# Altium schematic symbol library jlcpcb_2025_04_capacitors_extended_0805.schlib: 3281 symbols (part 16 of 18)
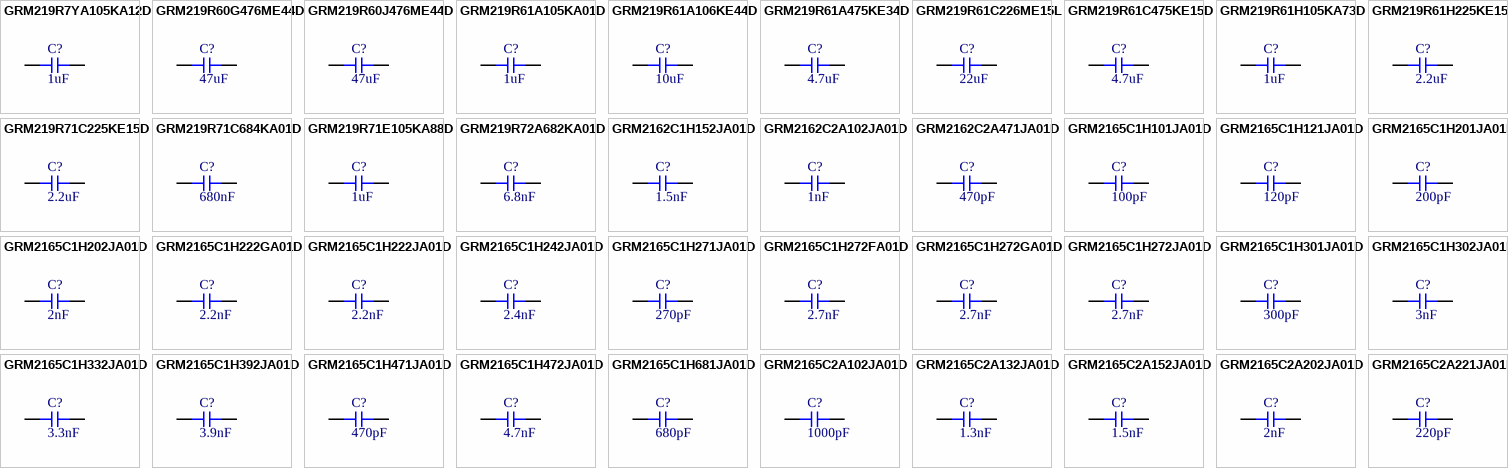
[diagram p97: symbols GRM219R7YA105KA12D to GRM2165C2A221JA01D]

## GRM2165C1H471JA01D
designator C?  Capacitance: 470pF  (hidden comment: *)
Capacitor, Ceramic (MLCC), 470pF, ±5%, 50V, C0G, ±5%, SMD 0805; Manufacturer: Murata Electronics; Manufacturer Part Number: GRM2165C1H471JA01D; Package Size: 0805; JLCPCB Basic Part: No; JLCPCB Part Number: C97902; Supplier 1: LCSC; Category: Capacitors - MLCC; Supplier Part Number 1: C97902; Tolerance: ±5%; Voltage Rating: 50V; Temperature Coefficient: C0G; RoHS: Yes; ComponentLink1Description: Datasheet; ComponentLink1URL: https://wmsc.lcsc.com/wmsc/upload/file/pdf/v2/lcsc/1811101813_Murata-Electronics-GRM2165C1H471JA01D_C97902.pdf; ComponentLink2Description: JLCPCB Part URL; ComponentLink2URL: https://jlcpcb.com/partdetail/C97902; ComponentLink3Description: LCSC Part URL; ComponentLink3URL: https://lcsc.com/product-detail/Multilayer-Ceramic-Capacitors-MLCC---SMD-SMT_Murata-Electronics-Murata-Electronics-GRM2165C1H471JA01D_C97902.html
footprint CAP-0805 (0805 (2012M) Capacitor)
pins: 1, 2

## GRM2165C1H472JA01D
designator C?  Capacitance: 4.7nF  (hidden comment: *)
Capacitor, Ceramic (MLCC), 4.7nF, ±5%, 50V, C0G, ±5%, SMD 0805; Manufacturer: Murata Electronics; Manufacturer Part Number: GRM2165C1H472JA01D; Package Size: 0805; JLCPCB Basic Part: No; JLCPCB Part Number: C77063; Supplier 1: LCSC; Category: Capacitors - MLCC; Supplier Part Number 1: C77063; Tolerance: ±5%; Voltage Rating: 50V; Temperature Coefficient: C0G; RoHS: Yes; ComponentLink1Description: Datasheet; ComponentLink1URL: https://wmsc.lcsc.com/wmsc/upload/file/pdf/v2/lcsc/2304140030_Murata-Electronics-GRM2165C1H472JA01D_C77063.pdf; ComponentLink2Description: JLCPCB Part URL; ComponentLink2URL: https://jlcpcb.com/partdetail/C77063; ComponentLink3Description: LCSC Part URL; ComponentLink3URL: https://lcsc.com/product-detail/Multilayer-Ceramic-Capacitors-MLCC---SMD-SMT_Murata-Electronics-Murata-Electronics-GRM2165C1H472JA01D_C77063.html
footprint CAP-0805 (0805 (2012M) Capacitor)
pins: 1, 2

## GRM2165C1H681JA01D
designator C?  Capacitance: 680pF  (hidden comment: *)
Capacitor, Ceramic (MLCC), 680pF, ±5%, 50V, C0G, ±5%, SMD 0805; Manufacturer: Murata Electronics; Manufacturer Part Number: GRM2165C1H681JA01D; Package Size: 0805; JLCPCB Basic Part: No; JLCPCB Part Number: C117988; Supplier 1: LCSC; Category: Capacitors - MLCC; Supplier Part Number 1: C117988; Tolerance: ±5%; Voltage Rating: 50V; Temperature Coefficient: C0G; RoHS: Yes; ComponentLink1Description: Datasheet; ComponentLink1URL: https://wmsc.lcsc.com/wmsc/upload/file/pdf/v2/lcsc/2304140030_Murata-Electronics-GRM2165C1H681JA01D_C117988.pdf; ComponentLink2Description: JLCPCB Part URL; ComponentLink2URL: https://jlcpcb.com/partdetail/C117988; ComponentLink3Description: LCSC Part URL; ComponentLink3URL: https://lcsc.com/product-detail/Multilayer-Ceramic-Capacitors-MLCC---SMD-SMT_Murata-Electronics-Murata-Electronics-GRM2165C1H681JA01D_C117988.html
footprint CAP-0805 (0805 (2012M) Capacitor)
pins: 1, 2

## GRM2165C2A102JA01D
designator C?  Capacitance: 1000pF  (hidden comment: *)
Capacitor, Ceramic (MLCC), 1000pF, ±5%, 100V, C0G, ±5%, SMD 0805; Manufacturer: Murata Electronics; Manufacturer Part Number: GRM2165C2A102JA01D; Package Size: 0805; JLCPCB Basic Part: No; JLCPCB Part Number: C162289; Supplier 1: LCSC; Category: Capacitors - MLCC; Supplier Part Number 1: C162289; Tolerance: ±5%; Voltage Rating: 100V; Temperature Coefficient: C0G; RoHS: Yes; ComponentLink1Description: Datasheet; ComponentLink1URL: https://wmsc.lcsc.com/wmsc/upload/file/pdf/v2/lcsc/2304140030_Murata-Electronics-GRM2165C2A102JA01D_C162289.pdf; ComponentLink2Description: JLCPCB Part URL; ComponentLink2URL: https://jlcpcb.com/partdetail/C162289; ComponentLink3Description: LCSC Part URL; ComponentLink3URL: https://lcsc.com/product-detail/Multilayer-Ceramic-Capacitors-MLCC---SMD-SMT_Murata-Electronics-Murata-Electronics-GRM2165C2A102JA01D_C162289.html
footprint CAP-0805 (0805 (2012M) Capacitor)
pins: 1, 2

## GRM2165C2A132JA01D
designator C?  Capacitance: 1.3nF  (hidden comment: *)
Capacitor, Ceramic (MLCC), 1.3nF, ±5%, 100V, null, ±5%, SMD 0805; Manufacturer: Murata Electronics; Manufacturer Part Number: GRM2165C2A132JA01D; Package Size: 0805; JLCPCB Basic Part: No; JLCPCB Part Number: C710937; Supplier 1: LCSC; Category: Capacitors - MLCC; Supplier Part Number 1: C710937; Tolerance: ±5%; Voltage Rating: 100V; Temperature Coefficient: null; RoHS: Yes; ComponentLink1Description: Datasheet; ComponentLink1URL: https://wmsc.lcsc.com/wmsc/upload/file/pdf/v2/lcsc/2101281807_Murata-Electronics-GRM2165C2A132JA01D_C710937.pdf; ComponentLink2Description: JLCPCB Part URL; ComponentLink2URL: https://jlcpcb.com/partdetail/C710937; ComponentLink3Description: LCSC Part URL; ComponentLink3URL: https://lcsc.com/product-detail/Multilayer-Ceramic-Capacitors-MLCC---SMD-SMT_Murata-Electronics-Murata-Electronics-GRM2165C2A132JA01D_C710937.html
footprint CAP-0805 (0805 (2012M) Capacitor)
pins: 1, 2

## GRM2165C2A152JA01D
designator C?  Capacitance: 1.5nF  (hidden comment: *)
Capacitor, Ceramic (MLCC), 1.5nF, ±5%, 100V, C0G, ±5%, SMD 0805; Manufacturer: Murata Electronics; Manufacturer Part Number: GRM2165C2A152JA01D; Package Size: 0805; JLCPCB Basic Part: No; JLCPCB Part Number: C184499; Supplier 1: LCSC; Category: Capacitors - MLCC; Supplier Part Number 1: C184499; Tolerance: ±5%; Voltage Rating: 100V; Temperature Coefficient: C0G; RoHS: Yes; ComponentLink1Description: Datasheet; ComponentLink1URL: https://wmsc.lcsc.com/wmsc/upload/file/pdf/v2/lcsc/2304140030_Murata-Electronics-GRM2165C2A152JA01D_C184499.pdf; ComponentLink2Description: JLCPCB Part URL; ComponentLink2URL: https://jlcpcb.com/partdetail/C184499; ComponentLink3Description: LCSC Part URL; ComponentLink3URL: https://lcsc.com/product-detail/Multilayer-Ceramic-Capacitors-MLCC---SMD-SMT_Murata-Electronics-Murata-Electronics-GRM2165C2A152JA01D_C184499.html
footprint CAP-0805 (0805 (2012M) Capacitor)
pins: 1, 2

## GRM2165C2A202JA01D
designator C?  Capacitance: 2nF  (hidden comment: *)
Capacitor, Ceramic (MLCC), 2nF, ±5%, 100V, null, ±5%, SMD 0805; Manufacturer: Murata Electronics; Manufacturer Part Number: GRM2165C2A202JA01D; Package Size: 0805; JLCPCB Basic Part: No; JLCPCB Part Number: C710939; Supplier 1: LCSC; Category: Capacitors - MLCC; Supplier Part Number 1: C710939; Tolerance: ±5%; Voltage Rating: 100V; Temperature Coefficient: null; RoHS: Yes; ComponentLink1Description: Datasheet; ComponentLink1URL: https://wmsc.lcsc.com/wmsc/upload/file/pdf/v2/lcsc/2103161034_Murata-Electronics-GRM2165C2A202JA01D_C710939.pdf; ComponentLink2Description: JLCPCB Part URL; ComponentLink2URL: https://jlcpcb.com/partdetail/C710939; ComponentLink3Description: LCSC Part URL; ComponentLink3URL: https://lcsc.com/product-detail/Multilayer-Ceramic-Capacitors-MLCC---SMD-SMT_Murata-Electronics-Murata-Electronics-GRM2165C2A202JA01D_C710939.html
footprint CAP-0805 (0805 (2012M) Capacitor)
pins: 1, 2

## GRM2165C2A221JA01D
designator C?  Capacitance: 220pF  (hidden comment: *)
Capacitor, Ceramic (MLCC), 220pF, ±5%, 100V, null, ±5%, SMD 0805; Manufacturer: Murata Electronics; Manufacturer Part Number: GRM2165C2A221JA01D; Package Size: 0805; JLCPCB Basic Part: No; JLCPCB Part Number: C701261; Supplier 1: LCSC; Category: Capacitors - MLCC; Supplier Part Number 1: C701261; Tolerance: ±5%; Voltage Rating: 100V; Temperature Coefficient: null; RoHS: Yes; ComponentLink1Description: Datasheet; ComponentLink1URL: https://wmsc.lcsc.com/wmsc/upload/file/pdf/v2/lcsc/2304140030_Murata-Electronics-GRM2165C2A221JA01D_C701261.pdf; ComponentLink2Description: JLCPCB Part URL; ComponentLink2URL: https://jlcpcb.com/partdetail/C701261; ComponentLink3Description: LCSC Part URL; ComponentLink3URL: https://lcsc.com/product-detail/Multilayer-Ceramic-Capacitors-MLCC---SMD-SMT_Murata-Electronics-Murata-Electronics-GRM2165C2A221JA01D_C701261.html
footprint CAP-0805 (0805 (2012M) Capacitor)
pins: 1, 2

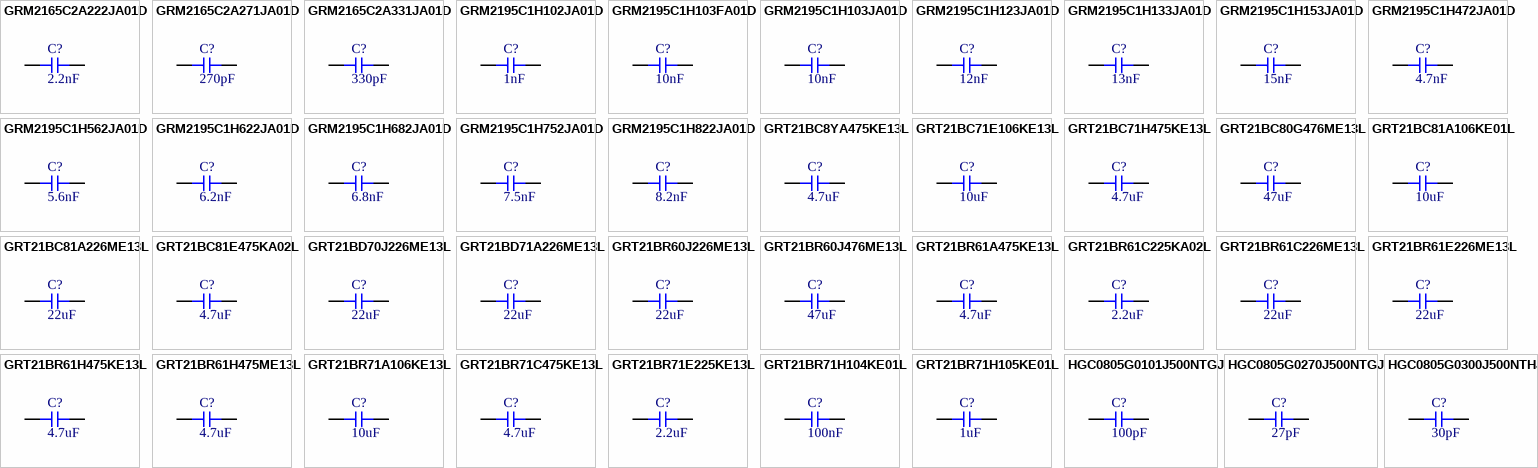
[diagram p69: symbols GRM2165C2A222JA01D to HGC0805G0300J500NTHJ]

## GRM2165C2A222JA01D
designator C?  Capacitance: 2.2nF  (hidden comment: *)
Capacitor, Ceramic (MLCC), 2.2nF, ±5%, 100V, C0G, ±5%, SMD 0805; Manufacturer: Murata Electronics; Manufacturer Part Number: GRM2165C2A222JA01D; Package Size: 0805; JLCPCB Basic Part: No; JLCPCB Part Number: C710940; Supplier 1: LCSC; Category: Capacitors - MLCC; Supplier Part Number 1: C710940; Tolerance: ±5%; Voltage Rating: 100V; Temperature Coefficient: C0G; RoHS: Yes; ComponentLink1Description: Datasheet; ComponentLink1URL: https://wmsc.lcsc.com/wmsc/upload/file/pdf/v2/lcsc/2108182030_Murata-Electronics-GRM2165C2A222JA01D_C710940.pdf; ComponentLink2Description: JLCPCB Part URL; ComponentLink2URL: https://jlcpcb.com/partdetail/C710940; ComponentLink3Description: LCSC Part URL; ComponentLink3URL: https://lcsc.com/product-detail/Multilayer-Ceramic-Capacitors-MLCC---SMD-SMT_Murata-Electronics-Murata-Electronics-GRM2165C2A222JA01D_C710940.html
footprint CAP-0805 (0805 (2012M) Capacitor)
pins: 1, 2

## GRM2165C2A271JA01D
designator C?  Capacitance: 270pF  (hidden comment: *)
Capacitor, Ceramic (MLCC), 270pF, ±5%, 100V, C0G, ±5%, SMD 0805; Manufacturer: Murata Electronics; Manufacturer Part Number: GRM2165C2A271JA01D; Package Size: 0805; JLCPCB Basic Part: No; JLCPCB Part Number: C710941; Supplier 1: LCSC; Category: Capacitors - MLCC; Supplier Part Number 1: C710941; Tolerance: ±5%; Voltage Rating: 100V; Temperature Coefficient: C0G; RoHS: Yes; ComponentLink1Description: Datasheet; ComponentLink1URL: https://wmsc.lcsc.com/wmsc/upload/file/pdf/v2/lcsc/2308111612_Murata-Electronics-GRM2165C2A271JA01D_C710941.pdf; ComponentLink2Description: JLCPCB Part URL; ComponentLink2URL: https://jlcpcb.com/partdetail/C710941; ComponentLink3Description: LCSC Part URL; ComponentLink3URL: https://lcsc.com/product-detail/Multilayer-Ceramic-Capacitors-MLCC---SMD-SMT_Murata-Electronics-Murata-Electronics-GRM2165C2A271JA01D_C710941.html
footprint CAP-0805 (0805 (2012M) Capacitor)
pins: 1, 2

## GRM2165C2A331JA01D
designator C?  Capacitance: 330pF  (hidden comment: *)
Capacitor, Ceramic (MLCC), 330pF, ±5%, 100V, null, ±5%, SMD 0805; Manufacturer: Murata Electronics; Manufacturer Part Number: GRM2165C2A331JA01D; Package Size: 0805; JLCPCB Basic Part: No; JLCPCB Part Number: C437543; Supplier 1: LCSC; Category: Capacitors - MLCC; Supplier Part Number 1: C437543; Tolerance: ±5%; Voltage Rating: 100V; Temperature Coefficient: null; RoHS: Yes; ComponentLink1Description: Datasheet; ComponentLink1URL: https://wmsc.lcsc.com/wmsc/upload/file/pdf/v2/lcsc/2304140030_Murata-Electronics-GRM2165C2A331JA01D_C437543.pdf; ComponentLink2Description: JLCPCB Part URL; ComponentLink2URL: https://jlcpcb.com/partdetail/C437543; ComponentLink3Description: LCSC Part URL; ComponentLink3URL: https://lcsc.com/product-detail/Multilayer-Ceramic-Capacitors-MLCC---SMD-SMT_Murata-Electronics-Murata-Electronics-GRM2165C2A331JA01D_C437543.html
footprint CAP-0805 (0805 (2012M) Capacitor)
pins: 1, 2

## GRM2195C1H102JA01D
designator C?  Capacitance: 1nF  (hidden comment: *)
Capacitor, Ceramic (MLCC), 1nF, ±5%, 50V, C0G, ±5%, SMD 0805; Manufacturer: Murata Electronics; Manufacturer Part Number: GRM2195C1H102JA01D; Package Size: 0805; JLCPCB Basic Part: No; JLCPCB Part Number: C701302; Supplier 1: LCSC; Category: Capacitors - MLCC; Supplier Part Number 1: C701302; Tolerance: ±5%; Voltage Rating: 50V; Temperature Coefficient: C0G; RoHS: Yes; ComponentLink1Description: Datasheet; ComponentLink1URL: https://wmsc.lcsc.com/wmsc/upload/file/pdf/v2/lcsc/2304140030_Murata-Electronics-GRM2195C1H102JA01D_C701302.pdf; ComponentLink2Description: JLCPCB Part URL; ComponentLink2URL: https://jlcpcb.com/partdetail/C701302; ComponentLink3Description: LCSC Part URL; ComponentLink3URL: https://lcsc.com/product-detail/Multilayer-Ceramic-Capacitors-MLCC---SMD-SMT_Murata-Electronics-Murata-Electronics-GRM2195C1H102JA01D_C701302.html
footprint CAP-0805 (0805 (2012M) Capacitor)
pins: 1, 2

## GRM2195C1H103FA01D
designator C?  Capacitance: 10nF  (hidden comment: *)
Capacitor, Ceramic (MLCC), 10nF, ±1%, 50V, C0G, ±1%, SMD 0805; Manufacturer: Murata Electronics; Manufacturer Part Number: GRM2195C1H103FA01D; Package Size: 0805; JLCPCB Basic Part: No; JLCPCB Part Number: C441760; Supplier 1: LCSC; Category: Capacitors - MLCC; Supplier Part Number 1: C441760; Tolerance: ±1%; Voltage Rating: 50V; Temperature Coefficient: C0G; RoHS: Yes; ComponentLink1Description: Datasheet; ComponentLink1URL: https://wmsc.lcsc.com/wmsc/upload/file/pdf/v2/lcsc/2304140030_Murata-Electronics-GRM2195C1H103FA01D_C441760.pdf; ComponentLink2Description: JLCPCB Part URL; ComponentLink2URL: https://jlcpcb.com/partdetail/C441760; ComponentLink3Description: LCSC Part URL; ComponentLink3URL: https://lcsc.com/product-detail/Multilayer-Ceramic-Capacitors-MLCC---SMD-SMT_Murata-Electronics-Murata-Electronics-GRM2195C1H103FA01D_C441760.html
footprint CAP-0805 (0805 (2012M) Capacitor)
pins: 1, 2

## GRM2195C1H103JA01D
designator C?  Capacitance: 10nF  (hidden comment: *)
Capacitor, Ceramic (MLCC), 10nF, ±5%, 50V, C0G, ±5%, SMD 0805; Manufacturer: Murata Electronics; Manufacturer Part Number: GRM2195C1H103JA01D; Package Size: 0805; JLCPCB Basic Part: No; JLCPCB Part Number: C97905; Supplier 1: LCSC; Category: Capacitors - MLCC; Supplier Part Number 1: C97905; Tolerance: ±5%; Voltage Rating: 50V; Temperature Coefficient: C0G; RoHS: Yes; ComponentLink1Description: Datasheet; ComponentLink1URL: https://wmsc.lcsc.com/wmsc/upload/file/pdf/v2/lcsc/1810201220_Murata-Electronics-GRM2195C1H103JA01D_C97905.pdf; ComponentLink2Description: JLCPCB Part URL; ComponentLink2URL: https://jlcpcb.com/partdetail/C97905; ComponentLink3Description: LCSC Part URL; ComponentLink3URL: https://lcsc.com/product-detail/Multilayer-Ceramic-Capacitors-MLCC---SMD-SMT_Murata-Electronics-Murata-Electronics-GRM2195C1H103JA01D_C97905.html
footprint CAP-0805 (0805 (2012M) Capacitor)
pins: 1, 2

## GRM2195C1H123JA01D
designator C?  Capacitance: 12nF  (hidden comment: *)
Capacitor, Ceramic (MLCC), 12nF, ±5%, 50V, C0G, ±5%, SMD 0805; Manufacturer: Murata Electronics; Manufacturer Part Number: GRM2195C1H123JA01D; Package Size: 0805; JLCPCB Basic Part: No; JLCPCB Part Number: C97906; Supplier 1: LCSC; Category: Capacitors - MLCC; Supplier Part Number 1: C97906; Tolerance: ±5%; Voltage Rating: 50V; Temperature Coefficient: C0G; RoHS: Yes; ComponentLink1Description: Datasheet; ComponentLink1URL: https://wmsc.lcsc.com/wmsc/upload/file/pdf/v2/lcsc/1810201248_Murata-Electronics-GRM2195C1H123JA01D_C97906.pdf; ComponentLink2Description: JLCPCB Part URL; ComponentLink2URL: https://jlcpcb.com/partdetail/C97906; ComponentLink3Description: LCSC Part URL; ComponentLink3URL: https://lcsc.com/product-detail/Multilayer-Ceramic-Capacitors-MLCC---SMD-SMT_Murata-Electronics-Murata-Electronics-GRM2195C1H123JA01D_C97906.html
footprint CAP-0805 (0805 (2012M) Capacitor)
pins: 1, 2

## GRM2195C1H133JA01D
designator C?  Capacitance: 13nF  (hidden comment: *)
Capacitor, Ceramic (MLCC), 13nF, ±5%, 50V, C0G, ±5%, SMD 0805; Manufacturer: Murata Electronics; Manufacturer Part Number: GRM2195C1H133JA01D; Package Size: 0805; JLCPCB Basic Part: No; JLCPCB Part Number: C710945; Supplier 1: LCSC; Category: Capacitors - MLCC; Supplier Part Number 1: C710945; Tolerance: ±5%; Voltage Rating: 50V; Temperature Coefficient: C0G; RoHS: Yes; ComponentLink1Description: Datasheet; ComponentLink1URL: https://wmsc.lcsc.com/wmsc/upload/file/pdf/v2/lcsc/2308111641_Murata-Electronics-GRM2195C1H133JA01D_C710945.pdf; ComponentLink2Description: JLCPCB Part URL; ComponentLink2URL: https://jlcpcb.com/partdetail/C710945; ComponentLink3Description: LCSC Part URL; ComponentLink3URL: https://lcsc.com/product-detail/Multilayer-Ceramic-Capacitors-MLCC---SMD-SMT_Murata-Electronics-Murata-Electronics-GRM2195C1H133JA01D_C710945.html
footprint CAP-0805 (0805 (2012M) Capacitor)
pins: 1, 2

## GRM2195C1H153JA01D
designator C?  Capacitance: 15nF  (hidden comment: *)
Capacitor, Ceramic (MLCC), 15nF, ±5%, 50V, C0G, ±5%, SMD 0805; Manufacturer: Murata Electronics; Manufacturer Part Number: GRM2195C1H153JA01D; Package Size: 0805; JLCPCB Basic Part: No; JLCPCB Part Number: C97907; Supplier 1: LCSC; Category: Capacitors - MLCC; Supplier Part Number 1: C97907; Tolerance: ±5%; Voltage Rating: 50V; Temperature Coefficient: C0G; RoHS: Yes; ComponentLink1Description: Datasheet; ComponentLink1URL: https://wmsc.lcsc.com/wmsc/upload/file/pdf/v2/lcsc/1810201220_Murata-Electronics-GRM2195C1H153JA01D_C97907.pdf; ComponentLink2Description: JLCPCB Part URL; ComponentLink2URL: https://jlcpcb.com/partdetail/C97907; ComponentLink3Description: LCSC Part URL; ComponentLink3URL: https://lcsc.com/product-detail/Multilayer-Ceramic-Capacitors-MLCC---SMD-SMT_Murata-Electronics-Murata-Electronics-GRM2195C1H153JA01D_C97907.html
footprint CAP-0805 (0805 (2012M) Capacitor)
pins: 1, 2

## GRM2195C1H472JA01D
designator C?  Capacitance: 4.7nF  (hidden comment: *)
Capacitor, Ceramic (MLCC), 4.7nF, ±5%, 50V, C0G, ±5%, SMD 0805; Manufacturer: Murata Electronics; Manufacturer Part Number: GRM2195C1H472JA01D; Package Size: 0805; JLCPCB Basic Part: No; JLCPCB Part Number: C710947; Supplier 1: LCSC; Category: Capacitors - MLCC; Supplier Part Number 1: C710947; Tolerance: ±5%; Voltage Rating: 50V; Temperature Coefficient: C0G; RoHS: Yes; ComponentLink1Description: Datasheet; ComponentLink1URL: https://wmsc.lcsc.com/wmsc/upload/file/pdf/v2/lcsc/2308111641_Murata-Electronics-GRM2195C1H472JA01D_C710947.pdf; ComponentLink2Description: JLCPCB Part URL; ComponentLink2URL: https://jlcpcb.com/partdetail/C710947; ComponentLink3Description: LCSC Part URL; ComponentLink3URL: https://lcsc.com/product-detail/Multilayer-Ceramic-Capacitors-MLCC---SMD-SMT_Murata-Electronics-Murata-Electronics-GRM2195C1H472JA01D_C710947.html
footprint CAP-0805 (0805 (2012M) Capacitor)
pins: 1, 2

## GRM2195C1H562JA01D
designator C?  Capacitance: 5.6nF  (hidden comment: *)
Capacitor, Ceramic (MLCC), 5.6nF, ±5%, 50V, C0G, ±5%, SMD 0805; Manufacturer: Murata Electronics; Manufacturer Part Number: GRM2195C1H562JA01D; Package Size: 0805; JLCPCB Basic Part: No; JLCPCB Part Number: C77067; Supplier 1: LCSC; Category: Capacitors - MLCC; Supplier Part Number 1: C77067; Tolerance: ±5%; Voltage Rating: 50V; Temperature Coefficient: C0G; RoHS: Yes; ComponentLink1Description: Datasheet; ComponentLink1URL: https://wmsc.lcsc.com/wmsc/upload/file/pdf/v2/lcsc/2304140030_Murata-Electronics-GRM2195C1H562JA01D_C77067.pdf; ComponentLink2Description: JLCPCB Part URL; ComponentLink2URL: https://jlcpcb.com/partdetail/C77067; ComponentLink3Description: LCSC Part URL; ComponentLink3URL: https://lcsc.com/product-detail/Multilayer-Ceramic-Capacitors-MLCC---SMD-SMT_Murata-Electronics-Murata-Electronics-GRM2195C1H562JA01D_C77067.html
footprint CAP-0805 (0805 (2012M) Capacitor)
pins: 1, 2

## GRM2195C1H622JA01D
designator C?  Capacitance: 6.2nF  (hidden comment: *)
Capacitor, Ceramic (MLCC), 6.2nF, ±5%, 50V, C0G, ±5%, SMD 0805; Manufacturer: Murata Electronics; Manufacturer Part Number: GRM2195C1H622JA01D; Package Size: 0805; JLCPCB Basic Part: No; JLCPCB Part Number: C710949; Supplier 1: LCSC; Category: Capacitors - MLCC; Supplier Part Number 1: C710949; Tolerance: ±5%; Voltage Rating: 50V; Temperature Coefficient: C0G; RoHS: Yes; ComponentLink1Description: Datasheet; ComponentLink1URL: https://wmsc.lcsc.com/wmsc/upload/file/pdf/v2/lcsc/2308111642_Murata-Electronics-GRM2195C1H622JA01D_C710949.pdf; ComponentLink2Description: JLCPCB Part URL; ComponentLink2URL: https://jlcpcb.com/partdetail/C710949; ComponentLink3Description: LCSC Part URL; ComponentLink3URL: https://lcsc.com/product-detail/Multilayer-Ceramic-Capacitors-MLCC---SMD-SMT_Murata-Electronics-Murata-Electronics-GRM2195C1H622JA01D_C710949.html
footprint CAP-0805 (0805 (2012M) Capacitor)
pins: 1, 2

## GRM2195C1H682JA01D
designator C?  Capacitance: 6.8nF  (hidden comment: *)
Capacitor, Ceramic (MLCC), 6.8nF, ±5%, 50V, C0G, ±5%, SMD 0805; Manufacturer: Murata Electronics; Manufacturer Part Number: GRM2195C1H682JA01D; Package Size: 0805; JLCPCB Basic Part: No; JLCPCB Part Number: C77068; Supplier 1: LCSC; Category: Capacitors - MLCC; Supplier Part Number 1: C77068; Tolerance: ±5%; Voltage Rating: 50V; Temperature Coefficient: C0G; RoHS: Yes; ComponentLink1Description: Datasheet; ComponentLink1URL: https://wmsc.lcsc.com/wmsc/upload/file/pdf/v2/lcsc/2304140030_Murata-Electronics-GRM2195C1H682JA01D_C77068.pdf; ComponentLink2Description: JLCPCB Part URL; ComponentLink2URL: https://jlcpcb.com/partdetail/C77068; ComponentLink3Description: LCSC Part URL; ComponentLink3URL: https://lcsc.com/product-detail/Multilayer-Ceramic-Capacitors-MLCC---SMD-SMT_Murata-Electronics-Murata-Electronics-GRM2195C1H682JA01D_C77068.html
footprint CAP-0805 (0805 (2012M) Capacitor)
pins: 1, 2

## GRM2195C1H752JA01D
designator C?  Capacitance: 7.5nF  (hidden comment: *)
Capacitor, Ceramic (MLCC), 7.5nF, ±5%, 50V, C0G, ±5%, SMD 0805; Manufacturer: Murata Electronics; Manufacturer Part Number: GRM2195C1H752JA01D; Package Size: 0805; JLCPCB Basic Part: No; JLCPCB Part Number: C710950; Supplier 1: LCSC; Category: Capacitors - MLCC; Supplier Part Number 1: C710950; Tolerance: ±5%; Voltage Rating: 50V; Temperature Coefficient: C0G; RoHS: Yes; ComponentLink1Description: Datasheet; ComponentLink1URL: https://wmsc.lcsc.com/wmsc/upload/file/pdf/v2/lcsc/2308111813_Murata-Electronics-GRM2195C1H752JA01D_C710950.pdf; ComponentLink2Description: JLCPCB Part URL; ComponentLink2URL: https://jlcpcb.com/partdetail/C710950; ComponentLink3Description: LCSC Part URL; ComponentLink3URL: https://lcsc.com/product-detail/Multilayer-Ceramic-Capacitors-MLCC---SMD-SMT_Murata-Electronics-Murata-Electronics-GRM2195C1H752JA01D_C710950.html
footprint CAP-0805 (0805 (2012M) Capacitor)
pins: 1, 2

## GRM2195C1H822JA01D
designator C?  Capacitance: 8.2nF  (hidden comment: *)
Capacitor, Ceramic (MLCC), 8.2nF, ±5%, 50V, C0G, ±5%, SMD 0805; Manufacturer: Murata Electronics; Manufacturer Part Number: GRM2195C1H822JA01D; Package Size: 0805; JLCPCB Basic Part: No; JLCPCB Part Number: C97908; Supplier 1: LCSC; Category: Capacitors - MLCC; Supplier Part Number 1: C97908; Tolerance: ±5%; Voltage Rating: 50V; Temperature Coefficient: C0G; RoHS: Yes; ComponentLink1Description: Datasheet; ComponentLink1URL: https://wmsc.lcsc.com/wmsc/upload/file/pdf/v2/lcsc/1810201249_Murata-Electronics-GRM2195C1H822JA01D_C97908.pdf; ComponentLink2Description: JLCPCB Part URL; ComponentLink2URL: https://jlcpcb.com/partdetail/C97908; ComponentLink3Description: LCSC Part URL; ComponentLink3URL: https://lcsc.com/product-detail/Multilayer-Ceramic-Capacitors-MLCC---SMD-SMT_Murata-Electronics-Murata-Electronics-GRM2195C1H822JA01D_C97908.html
footprint CAP-0805 (0805 (2012M) Capacitor)
pins: 1, 2

## GRT21BC8YA475KE13L
designator C?  Capacitance: 4.7uF  (hidden comment: *)
Capacitor, Ceramic (MLCC), 4.7uF, ±10%, 35V, X6S, ±10%, SMD 0805; Manufacturer: Murata Electronics; Manufacturer Part Number: GRT21BC8YA475KE13L; Package Size: 0805; JLCPCB Basic Part: No; JLCPCB Part Number: C711102; Supplier 1: LCSC; Category: Capacitors - MLCC; Supplier Part Number 1: C711102; Tolerance: ±10%; Voltage Rating: 35V; Temperature Coefficient: X6S; RoHS: Yes; ComponentLink1Description: Datasheet; ComponentLink1URL: https://wmsc.lcsc.com/wmsc/upload/file/pdf/v2/lcsc/2210190600_Murata-Electronics-GRT21BC8YA475KE13L_C711102.pdf; ComponentLink2Description: JLCPCB Part URL; ComponentLink2URL: https://jlcpcb.com/partdetail/C711102; ComponentLink3Description: LCSC Part URL; ComponentLink3URL: https://lcsc.com/product-detail/Multilayer-Ceramic-Capacitors-MLCC---SMD-SMT_Murata-Electronics-Murata-Electronics-GRT21BC8YA475KE13L_C711102.html
footprint CAP-0805 (0805 (2012M) Capacitor)
pins: 1, 2

## GRT21BC71E106KE13L
designator C?  Capacitance: 10uF  (hidden comment: *)
Capacitor, Ceramic (MLCC), 10uF, ±10%, 25V, ±10%, SMD 0805; Manufacturer: Murata Electronics; Manufacturer Part Number: GRT21BC71E106KE13L; Package Size: 0805; JLCPCB Basic Part: No; JLCPCB Part Number: C882505; Supplier 1: LCSC; Category: Capacitors - MLCC; Supplier Part Number 1: C882505; Tolerance: ±10%; Voltage Rating: 25V; RoHS: Yes; ComponentLink1Description: Datasheet; ComponentLink1URL: https://wmsc.lcsc.com/wmsc/upload/file/pdf/v2/lcsc/2201242130_Murata-Electronics-GRT21BC71E106KE13L_C882505.pdf; ComponentLink2Description: JLCPCB Part URL; ComponentLink2URL: https://jlcpcb.com/partdetail/C882505; ComponentLink3Description: LCSC Part URL; ComponentLink3URL: https://lcsc.com/product-detail/Multilayer-Ceramic-Capacitors-MLCC---SMD-SMT_Murata-Electronics-Murata-Electronics-GRT21BC71E106KE13L_C882505.html
footprint CAP-0805 (0805 (2012M) Capacitor)
pins: 1, 2

## GRT21BC71H475KE13L
designator C?  Capacitance: 4.7uF  (hidden comment: *)
Capacitor, Ceramic (MLCC), 4.7uF, ±10%, 50V, X7S, ±10%, SMD 0805; Manufacturer: Murata Electronics; Manufacturer Part Number: GRT21BC71H475KE13L; Package Size: 0805; JLCPCB Basic Part: No; JLCPCB Part Number: C3861036; Supplier 1: LCSC; Category: Capacitors - MLCC; Supplier Part Number 1: C3861036; Tolerance: ±10%; Voltage Rating: 50V; Temperature Coefficient: X7S; RoHS: Yes; ComponentLink1Description: Datasheet; ComponentLink1URL: https://wmsc.lcsc.com/wmsc/upload/file/pdf/v2/lcsc/2308111526_Murata-Electronics-GRT21BC71H475KE13L_C3861036.pdf; ComponentLink2Description: JLCPCB Part URL; ComponentLink2URL: https://jlcpcb.com/partdetail/C3861036; ComponentLink3Description: LCSC Part URL; ComponentLink3URL: https://lcsc.com/product-detail/Multilayer-Ceramic-Capacitors-MLCC---SMD-SMT_Murata-Electronics-Murata-Electronics-GRT21BC71H475KE13L_C3861036.html
footprint CAP-0805 (0805 (2012M) Capacitor)
pins: 1, 2

## GRT21BC80G476ME13L
designator C?  Capacitance: 47uF  (hidden comment: *)
Capacitor, Ceramic (MLCC), 47uF, ±20%, 4V, X6S, ±20%, SMD 0805; Manufacturer: Murata Electronics; Manufacturer Part Number: GRT21BC80G476ME13L; Package Size: 0805; JLCPCB Basic Part: No; JLCPCB Part Number: C711101; Supplier 1: LCSC; Category: Capacitors - MLCC; Supplier Part Number 1: C711101; Tolerance: ±20%; Voltage Rating: 4V; Temperature Coefficient: X6S; RoHS: Yes; ComponentLink1Description: Datasheet; ComponentLink1URL: https://wmsc.lcsc.com/wmsc/upload/file/pdf/v2/lcsc/2308111813_Murata-Electronics-GRT21BC80G476ME13L_C711101.pdf; ComponentLink2Description: JLCPCB Part URL; ComponentLink2URL: https://jlcpcb.com/partdetail/C711101; ComponentLink3Description: LCSC Part URL; ComponentLink3URL: https://lcsc.com/product-detail/Multilayer-Ceramic-Capacitors-MLCC---SMD-SMT_Murata-Electronics-Murata-Electronics-GRT21BC80G476ME13L_C711101.html
footprint CAP-0805 (0805 (2012M) Capacitor)
pins: 1, 2

## GRT21BC81A106KE01L
designator C?  Capacitance: 10uF  (hidden comment: *)
Capacitor, Ceramic (MLCC), 10uF, ±10%, 10V, X6S, ±10%, SMD 0805; Manufacturer: Murata Electronics; Manufacturer Part Number: GRT21BC81A106KE01L; Package Size: 0805; JLCPCB Basic Part: No; JLCPCB Part Number: C3902009; Supplier 1: LCSC; Category: Capacitors - MLCC; Supplier Part Number 1: C3902009; Tolerance: ±10%; Voltage Rating: 10V; Temperature Coefficient: X6S; RoHS: Yes; ComponentLink1Description: Datasheet; ComponentLink1URL: https://wmsc.lcsc.com/wmsc/upload/file/pdf/v2/lcsc/2207121430_Murata-Electronics-GRT21BC81A106KE01L_C3902009.pdf; ComponentLink2Description: JLCPCB Part URL; ComponentLink2URL: https://jlcpcb.com/partdetail/C3902009; ComponentLink3Description: LCSC Part URL; ComponentLink3URL: https://lcsc.com/product-detail/Multilayer-Ceramic-Capacitors-MLCC---SMD-SMT_Murata-Electronics-Murata-Electronics-GRT21BC81A106KE01L_C3902009.html
footprint CAP-0805 (0805 (2012M) Capacitor)
pins: 1, 2

## GRT21BC81A226ME13L
designator C?  Capacitance: 22uF  (hidden comment: *)
Capacitor, Ceramic (MLCC), 22uF, ±20%, 10V, X6S, ±20%, SMD 0805; Manufacturer: Murata Electronics; Manufacturer Part Number: GRT21BC81A226ME13L; Package Size: 0805; JLCPCB Basic Part: No; JLCPCB Part Number: C126633; Supplier 1: LCSC; Category: Capacitors - MLCC; Supplier Part Number 1: C126633; Tolerance: ±20%; Voltage Rating: 10V; Temperature Coefficient: X6S; RoHS: Yes; ComponentLink1Description: Datasheet; ComponentLink1URL: https://wmsc.lcsc.com/wmsc/upload/file/pdf/v2/lcsc/1810201231_Murata-Electronics-GRT21BC81A226ME13L_C126633.pdf; ComponentLink2Description: JLCPCB Part URL; ComponentLink2URL: https://jlcpcb.com/partdetail/C126633; ComponentLink3Description: LCSC Part URL; ComponentLink3URL: https://lcsc.com/product-detail/Multilayer-Ceramic-Capacitors-MLCC---SMD-SMT_Murata-Electronics-Murata-Electronics-GRT21BC81A226ME13L_C126633.html
footprint CAP-0805 (0805 (2012M) Capacitor)
pins: 1, 2

## GRT21BC81E475KA02L
designator C?  Capacitance: 4.7uF  (hidden comment: *)
Capacitor, Ceramic (MLCC), 4.7uF, ±10%, 25V, X6S, ±10%, SMD 0805; Manufacturer: Murata Electronics; Manufacturer Part Number: GRT21BC81E475KA02L; Package Size: 0805; JLCPCB Basic Part: No; JLCPCB Part Number: C3872012; Supplier 1: LCSC; Category: Capacitors - MLCC; Supplier Part Number 1: C3872012; Tolerance: ±10%; Voltage Rating: 25V; Temperature Coefficient: X6S; RoHS: Yes; ComponentLink1Description: Datasheet; ComponentLink1URL: https://wmsc.lcsc.com/wmsc/upload/file/pdf/v2/lcsc/2207121430_Murata-Electronics-GRT21BC81E475KA02L_C3872012.pdf; ComponentLink2Description: JLCPCB Part URL; ComponentLink2URL: https://jlcpcb.com/partdetail/C3872012; ComponentLink3Description: LCSC Part URL; ComponentLink3URL: https://lcsc.com/product-detail/Multilayer-Ceramic-Capacitors-MLCC---SMD-SMT_Murata-Electronics-Murata-Electronics-GRT21BC81E475KA02L_C3872012.html
footprint CAP-0805 (0805 (2012M) Capacitor)
pins: 1, 2

## GRT21BD70J226ME13L
designator C?  Capacitance: 22uF  (hidden comment: *)
Capacitor, Ceramic (MLCC), 22uF, ±20%, 6.3V, X7T, ±20%, SMD 0805; Manufacturer: Murata Electronics; Manufacturer Part Number: GRT21BD70J226ME13L; Package Size: 0805; JLCPCB Basic Part: No; JLCPCB Part Number: C3010429; Supplier 1: LCSC; Category: Capacitors - MLCC; Supplier Part Number 1: C3010429; Tolerance: ±20%; Voltage Rating: 6.3V; Temperature Coefficient: X7T; RoHS: Yes; ComponentLink1Description: Datasheet; ComponentLink1URL: https://wmsc.lcsc.com/wmsc/upload/file/pdf/v2/lcsc/2206021745_Murata-Electronics-GRT21BD70J226ME13L_C3010429.pdf; ComponentLink2Description: JLCPCB Part URL; ComponentLink2URL: https://jlcpcb.com/partdetail/C3010429; ComponentLink3Description: LCSC Part URL; ComponentLink3URL: https://lcsc.com/product-detail/Multilayer-Ceramic-Capacitors-MLCC---SMD-SMT_Murata-Electronics-Murata-Electronics-GRT21BD70J226ME13L_C3010429.html
footprint CAP-0805 (0805 (2012M) Capacitor)
pins: 1, 2

## GRT21BD71A226ME13L
designator C?  Capacitance: 22uF  (hidden comment: *)
Capacitor, Ceramic (MLCC), 22uF, ±20%, 10V, X7T, ±20%, SMD 0805; Manufacturer: Murata Electronics; Manufacturer Part Number: GRT21BD71A226ME13L; Package Size: 0805; JLCPCB Basic Part: No; JLCPCB Part Number: C782176; Supplier 1: LCSC; Category: Capacitors - MLCC; Supplier Part Number 1: C782176; Tolerance: ±20%; Voltage Rating: 10V; Temperature Coefficient: X7T; RoHS: Yes; ComponentLink1Description: Datasheet; ComponentLink1URL: https://wmsc.lcsc.com/wmsc/upload/file/pdf/v2/lcsc/2009161209_Murata-Electronics-GRT21BD71A226ME13L_C782176.pdf; ComponentLink2Description: JLCPCB Part URL; ComponentLink2URL: https://jlcpcb.com/partdetail/C782176; ComponentLink3Description: LCSC Part URL; ComponentLink3URL: https://lcsc.com/product-detail/Multilayer-Ceramic-Capacitors-MLCC---SMD-SMT_Murata-Electronics-Murata-Electronics-GRT21BD71A226ME13L_C782176.html
footprint CAP-0805 (0805 (2012M) Capacitor)
pins: 1, 2

## GRT21BR60J226ME13L
designator C?  Capacitance: 22uF  (hidden comment: *)
Capacitor, Ceramic (MLCC), 22uF, ±20%, 6.3V, X5R, ±20%, SMD 0805; Manufacturer: Murata Electronics; Manufacturer Part Number: GRT21BR60J226ME13L; Package Size: 0805; JLCPCB Basic Part: No; JLCPCB Part Number: C782177; Supplier 1: LCSC; Category: Capacitors - MLCC; Supplier Part Number 1: C782177; Tolerance: ±20%; Voltage Rating: 6.3V; Temperature Coefficient: X5R; RoHS: Yes; ComponentLink1Description: Datasheet; ComponentLink1URL: https://wmsc.lcsc.com/wmsc/upload/file/pdf/v2/lcsc/2009161209_Murata-Electronics-GRT21BR60J226ME13L_C782177.pdf; ComponentLink2Description: JLCPCB Part URL; ComponentLink2URL: https://jlcpcb.com/partdetail/C782177; ComponentLink3Description: LCSC Part URL; ComponentLink3URL: https://lcsc.com/product-detail/Multilayer-Ceramic-Capacitors-MLCC---SMD-SMT_Murata-Electronics-Murata-Electronics-GRT21BR60J226ME13L_C782177.html
footprint CAP-0805 (0805 (2012M) Capacitor)
pins: 1, 2

## GRT21BR60J476ME13L
designator C?  Capacitance: 47uF  (hidden comment: *)
Capacitor, Ceramic (MLCC), 47uF, ±20%, 6.3V, X5R, ±20%, SMD 0805; Manufacturer: Murata Electronics; Manufacturer Part Number: GRT21BR60J476ME13L; Package Size: 0805; JLCPCB Basic Part: No; JLCPCB Part Number: C711103; Supplier 1: LCSC; Category: Capacitors - MLCC; Supplier Part Number 1: C711103; Tolerance: ±20%; Voltage Rating: 6.3V; Temperature Coefficient: X5R; RoHS: Yes; ComponentLink1Description: Datasheet; ComponentLink1URL: https://wmsc.lcsc.com/wmsc/upload/file/pdf/v2/lcsc/2203221230_Murata-Electronics-GRT21BR60J476ME13L_C711103.pdf; ComponentLink2Description: JLCPCB Part URL; ComponentLink2URL: https://jlcpcb.com/partdetail/C711103; ComponentLink3Description: LCSC Part URL; ComponentLink3URL: https://lcsc.com/product-detail/Multilayer-Ceramic-Capacitors-MLCC---SMD-SMT_Murata-Electronics-Murata-Electronics-GRT21BR60J476ME13L_C711103.html
footprint CAP-0805 (0805 (2012M) Capacitor)
pins: 1, 2

## GRT21BR61A475KE13L
designator C?  Capacitance: 4.7uF  (hidden comment: *)
Capacitor, Ceramic (MLCC), 4.7uF, ±10%, 10V, X5R, ±10%, SMD 0805; Manufacturer: Murata Electronics; Manufacturer Part Number: GRT21BR61A475KE13L; Package Size: 0805; JLCPCB Basic Part: No; JLCPCB Part Number: C907963; Supplier 1: LCSC; Category: Capacitors - MLCC; Supplier Part Number 1: C907963; Tolerance: ±10%; Voltage Rating: 10V; Temperature Coefficient: X5R; RoHS: Yes; ComponentLink1Description: Datasheet; ComponentLink1URL: https://wmsc.lcsc.com/wmsc/upload/file/pdf/v2/lcsc/2011031039_Murata-Electronics-GRT21BR61A475KE13L_C907963.pdf; ComponentLink2Description: JLCPCB Part URL; ComponentLink2URL: https://jlcpcb.com/partdetail/C907963; ComponentLink3Description: LCSC Part URL; ComponentLink3URL: https://lcsc.com/product-detail/Multilayer-Ceramic-Capacitors-MLCC---SMD-SMT_Murata-Electronics-Murata-Electronics-GRT21BR61A475KE13L_C907963.html
footprint CAP-0805 (0805 (2012M) Capacitor)
pins: 1, 2

## GRT21BR61C225KA02L
designator C?  Capacitance: 2.2uF  (hidden comment: *)
Capacitor, Ceramic (MLCC), 2.2uF, ±10%, 16V, ±10%, SMD 0805; Manufacturer: Murata Electronics; Manufacturer Part Number: GRT21BR61C225KA02L; Package Size: 0805; JLCPCB Basic Part: No; JLCPCB Part Number: C907962; Supplier 1: LCSC; Category: Capacitors - MLCC; Supplier Part Number 1: C907962; Tolerance: ±10%; Voltage Rating: 16V; RoHS: Yes; ComponentLink1Description: Datasheet; ComponentLink1URL: https://wmsc.lcsc.com/wmsc/upload/file/pdf/v2/lcsc/2304140030_Murata-Electronics-GRT21BR61C225KA02L_C907962.pdf; ComponentLink2Description: JLCPCB Part URL; ComponentLink2URL: https://jlcpcb.com/partdetail/C907962; ComponentLink3Description: LCSC Part URL; ComponentLink3URL: https://lcsc.com/product-detail/Multilayer-Ceramic-Capacitors-MLCC---SMD-SMT_Murata-Electronics-Murata-Electronics-GRT21BR61C225KA02L_C907962.html
footprint CAP-0805 (0805 (2012M) Capacitor)
pins: 1, 2

## GRT21BR61C226ME13L
designator C?  Capacitance: 22uF  (hidden comment: *)
Capacitor, Ceramic (MLCC), 22uF, ±20%, 16V, ±20%, SMD 0805; Manufacturer: Murata Electronics; Manufacturer Part Number: GRT21BR61C226ME13L; Package Size: 0805; JLCPCB Basic Part: No; JLCPCB Part Number: C711104; Supplier 1: LCSC; Category: Capacitors - MLCC; Supplier Part Number 1: C711104; Tolerance: ±20%; Voltage Rating: 16V; RoHS: Yes; ComponentLink1Description: Datasheet; ComponentLink1URL: https://wmsc.lcsc.com/wmsc/upload/file/pdf/v2/lcsc/2012231244_Murata-Electronics-GRT21BR61C226ME13L_C711104.pdf; ComponentLink2Description: JLCPCB Part URL; ComponentLink2URL: https://jlcpcb.com/partdetail/C711104; ComponentLink3Description: LCSC Part URL; ComponentLink3URL: https://lcsc.com/product-detail/Multilayer-Ceramic-Capacitors-MLCC---SMD-SMT_Murata-Electronics-Murata-Electronics-GRT21BR61C226ME13L_C711104.html
footprint CAP-0805 (0805 (2012M) Capacitor)
pins: 1, 2

## GRT21BR61E226ME13L
designator C?  Capacitance: 22uF  (hidden comment: *)
Capacitor, Ceramic (MLCC), 22uF, ±20%, 25V, X5R, ±20%, SMD 0805; Manufacturer: Murata Electronics; Manufacturer Part Number: GRT21BR61E226ME13L; Package Size: 0805; JLCPCB Basic Part: No; JLCPCB Part Number: C398931; Supplier 1: LCSC; Category: Capacitors - MLCC; Supplier Part Number 1: C398931; Tolerance: ±20%; Voltage Rating: 25V; Temperature Coefficient: X5R; RoHS: Yes; ComponentLink1Description: Datasheet; ComponentLink1URL: https://wmsc.lcsc.com/wmsc/upload/file/pdf/v2/lcsc/1912111437_Murata-Electronics-GRT21BR61E226ME13L_C398931.pdf; ComponentLink2Description: JLCPCB Part URL; ComponentLink2URL: https://jlcpcb.com/partdetail/C398931; ComponentLink3Description: LCSC Part URL; ComponentLink3URL: https://lcsc.com/product-detail/Multilayer-Ceramic-Capacitors-MLCC---SMD-SMT_Murata-Electronics-Murata-Electronics-GRT21BR61E226ME13L_C398931.html
footprint CAP-0805 (0805 (2012M) Capacitor)
pins: 1, 2

## GRT21BR61H475KE13L
designator C?  Capacitance: 4.7uF  (hidden comment: *)
Capacitor, Ceramic (MLCC), 4.7uF, ±10%, 50V, X5R, ±10%, SMD 0805; Manufacturer: Murata Electronics; Manufacturer Part Number: GRT21BR61H475KE13L; Package Size: 0805; JLCPCB Basic Part: No; JLCPCB Part Number: C437576; Supplier 1: LCSC; Category: Capacitors - MLCC; Supplier Part Number 1: C437576; Tolerance: ±10%; Voltage Rating: 50V; Temperature Coefficient: X5R; RoHS: Yes; ComponentLink1Description: Datasheet; ComponentLink1URL: https://wmsc.lcsc.com/wmsc/upload/file/pdf/v2/lcsc/2304140030_Murata-Electronics-GRT21BR61H475KE13L_C437576.pdf; ComponentLink2Description: JLCPCB Part URL; ComponentLink2URL: https://jlcpcb.com/partdetail/C437576; ComponentLink3Description: LCSC Part URL; ComponentLink3URL: https://lcsc.com/product-detail/Multilayer-Ceramic-Capacitors-MLCC---SMD-SMT_Murata-Electronics-Murata-Electronics-GRT21BR61H475KE13L_C437576.html
footprint CAP-0805 (0805 (2012M) Capacitor)
pins: 1, 2

## GRT21BR61H475ME13L
designator C?  Capacitance: 4.7uF  (hidden comment: *)
Capacitor, Ceramic (MLCC), 4.7uF, ±20%, 50V, ±20%, SMD 0805; Manufacturer: Murata Electronics; Manufacturer Part Number: GRT21BR61H475ME13L; Package Size: 0805; JLCPCB Basic Part: No; JLCPCB Part Number: C2177991; Supplier 1: LCSC; Category: Capacitors - MLCC; Supplier Part Number 1: C2177991; Tolerance: ±20%; Voltage Rating: 50V; RoHS: Yes; ComponentLink1Description: Datasheet; ComponentLink1URL: https://wmsc.lcsc.com/wmsc/upload/file/pdf/v2/lcsc/2108051830_Murata-Electronics-GRT21BR61H475ME13L_C2177991.pdf; ComponentLink2Description: JLCPCB Part URL; ComponentLink2URL: https://jlcpcb.com/partdetail/C2177991; ComponentLink3Description: LCSC Part URL; ComponentLink3URL: https://lcsc.com/product-detail/Multilayer-Ceramic-Capacitors-MLCC---SMD-SMT_Murata-Electronics-Murata-Electronics-GRT21BR61H475ME13L_C2177991.html
footprint CAP-0805 (0805 (2012M) Capacitor)
pins: 1, 2

## GRT21BR71A106KE13L
designator C?  Capacitance: 10uF  (hidden comment: *)
Capacitor, Ceramic (MLCC), 10uF, ±10%, 10V, X7R, ±10%, SMD 0805; Manufacturer: Murata Electronics; Manufacturer Part Number: GRT21BR71A106KE13L; Package Size: 0805; JLCPCB Basic Part: No; JLCPCB Part Number: C126635; Supplier 1: LCSC; Category: Capacitors - MLCC; Supplier Part Number 1: C126635; Tolerance: ±10%; Voltage Rating: 10V; Temperature Coefficient: X7R; RoHS: Yes; ComponentLink1Description: Datasheet; ComponentLink1URL: https://wmsc.lcsc.com/wmsc/upload/file/pdf/v2/lcsc/1810201230_Murata-Electronics-GRT21BR71A106KE13L_C126635.pdf; ComponentLink2Description: JLCPCB Part URL; ComponentLink2URL: https://jlcpcb.com/partdetail/C126635; ComponentLink3Description: LCSC Part URL; ComponentLink3URL: https://lcsc.com/product-detail/Multilayer-Ceramic-Capacitors-MLCC---SMD-SMT_Murata-Electronics-Murata-Electronics-GRT21BR71A106KE13L_C126635.html
footprint CAP-0805 (0805 (2012M) Capacitor)
pins: 1, 2

## GRT21BR71C475KE13L
designator C?  Capacitance: 4.7uF  (hidden comment: *)
Capacitor, Ceramic (MLCC), 4.7uF, ±10%, 16V, X7R, ±10%, SMD 0805; Manufacturer: Murata Electronics; Manufacturer Part Number: GRT21BR71C475KE13L; Package Size: 0805; JLCPCB Basic Part: No; JLCPCB Part Number: C723891; Supplier 1: LCSC; Category: Capacitors - MLCC; Supplier Part Number 1: C723891; Tolerance: ±10%; Voltage Rating: 16V; Temperature Coefficient: X7R; RoHS: Yes; ComponentLink1Description: Datasheet; ComponentLink1URL: https://wmsc.lcsc.com/wmsc/upload/file/pdf/v2/lcsc/2008241234_Murata-Electronics-GRT21BR71C475KE13L_C723891.pdf; ComponentLink2Description: JLCPCB Part URL; ComponentLink2URL: https://jlcpcb.com/partdetail/C723891; ComponentLink3Description: LCSC Part URL; ComponentLink3URL: https://lcsc.com/product-detail/Multilayer-Ceramic-Capacitors-MLCC---SMD-SMT_Murata-Electronics-Murata-Electronics-GRT21BR71C475KE13L_C723891.html
footprint CAP-0805 (0805 (2012M) Capacitor)
pins: 1, 2
